# Altium footprint library 20-Switches.PcbLib: 110 footprints (part 1 of 7)
Each footprint in its own frame and in the unit in brackets; x right, y up, seen from the top. Pads: shape width x height; smd on the part's side, far side on the other; paste and mask are expansions set on the pad; w line width, h text height; cw(c..) or ccw(c..) is an arc to the next point about the centre after c.
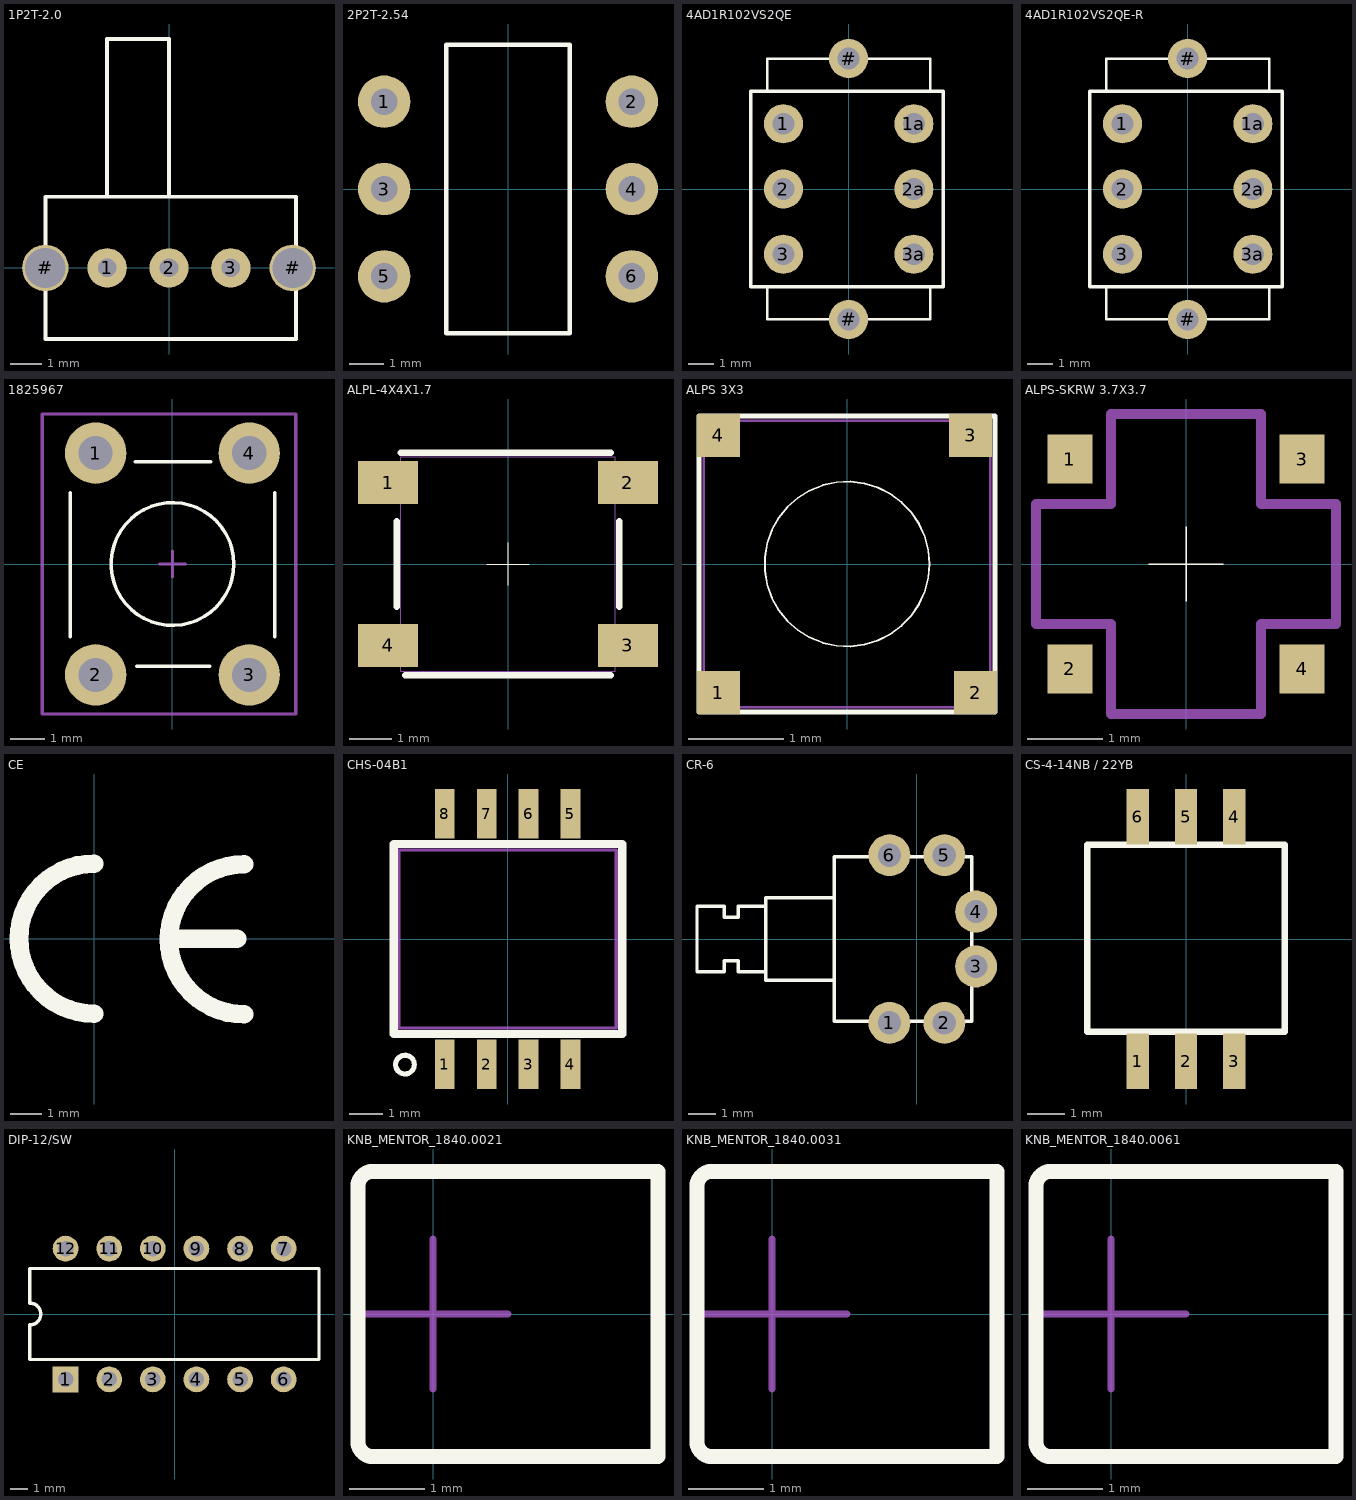
[diagram p0: the footprints below, top view; thin cyan lines are the x and y axes]

## 1P2T-2.0 [mm]
height 18.5
pads (5):
  round 1.27 hole 0.6: 1(-2,0) 2(0,0) 3(2,0)
  round 1.5 hole 1.3: #(-4,0) #(4,0)
Top Overlay:
  lines w0.127: -2,2.3 -2,7.4 0,7.4 0,2.3 ; -4,-2.3 4.1,-2.3 4.1,2.3 -4,2.3 -4,-2.3
3D body "sw-1p2t-2_0.stp": height 4.8, standoff -2.5, extent -4.3,-2.25 4.3,7.95

## 2P2T-2.54 [mil]
height 728.35
pads (6):
  round 60 hole 30: 1(-141.73,100) 2(141.73,100) 3(-141.73,0) 4(141.73,0) 5(-141.73,-100) 6(141.73,-100)
Top Overlay:
  lines w5: -70.87,-165.35 70.87,-165.35 70.87,165.35 -70.87,165.35 -70.87,-165.35
3D body "sw-2p2t-2_54.stp": height 125, standoff -29.53, extent -150.38,-161.41 150.37,161.42

## 4AD1R102VS2QE [mil]
height 728.35
pads (8):
  round 60 hole 33.46: 1(-100,100) 1a(100,100) 2(-100,0) 2a(100,0) 3(-100,-100) 3a(100,-100) #(0,-200) #(0,200)
Top Overlay:
  lines w3.94: -125,-150 -125,-200 125,-200 125,-150 ; -125,150 -125,200 125,200 125,150
  lines w5: -150,-150 145,-150 145,150 -150,150 -150,-150
3D body "ip67-6.stp": height 764.35, standoff -127.13, extent -197.83,-287.54 197.84,324.56

## 4AD1R102VS2QE-R [mil]
height 728.35
pads (8):
  round 60 hole 33.46: 1(-100,100) 1a(100,100) 2(-100,0) 2a(100,0) 3(-100,-100) 3a(100,-100) #(0,-200) #(0,200)
Top Overlay:
  lines w3.94: -125,-150 -125,-200 125,-200 125,-150 ; -125,150 -125,200 100,200 125,200 125,150
  lines w5: -150,-150 -150,150 145,150 145,-150 -150,-150
3D body "ip67-6R.stp": height 764.35, standoff -127.13, extent -197.83,-287.54 197.84,324.56

## 1825967 [mm] "AMP,1825967,6X6"
height 18.5
pads (4):
  round 1.8 hole 1: 1(-2.25,3.25) 2(-2.25,-3.25) 3(2.25,-3.25) 4(2.25,3.25)
Top Overlay:
  circle w0.1: c0,0 r1.799
  lines w0.1: -3,-2.134 -3,2.083 ; -1.092,2.997 1.118,2.997 ; -1.041,-2.997 1.092,-2.997 ; 3,-2.134 3,2.083
Mechanical 11:
  lines w0.1: -0.381,0 0.381,0 ; 0,-0.381 0,0.381 ; -3.81,-4.394 -3.81,4.394 3.607,4.394 3.607,-4.394 -3.81,-4.394
3D body "1825976.stp": height 6.57, standoff -2.29, extent -3,-3.393 3,3.393
3D body "1_6-1_6-0_6-1_8.stp": height 0.05, standoff -1.75, extent -3.05,2.45 -1.45,4.05
3D body "1_6-1_6-0_6-1_8.stp": height 0.05, standoff -1.75, extent 1.45,2.45 3.05,4.05
3D body "1_6-1_6-0_6-1_8.stp": height 0.05, standoff -1.75, extent -3.05,-4.05 -1.45,-2.45
3D body "1_6-1_6-0_6-1_8.stp": height 0.05, standoff -1.75, extent 1.45,-4.05 3.05,-2.45

## ALPL-4X4X1.7 [mm]
height 18.5
pads (4):
  rect 1.4x1 smd: 1(-2.8,1.9) 2(2.8,1.9) 3(2.8,-1.9) 4(-2.8,-1.9)
Top Overlay:
  lines w0.02: -0.5,0 0.5,0 ; 0,-0.5 0,0.5
  lines w0.15: -2.6,-1 -2.6,1 ; -2.5,2.6 2.4,2.6 ; -2.4,-2.6 2.4,-2.6 ; 2.6,-1 2.6,1
Mechanical 14:
  lines w0.01: -2.5,-2.5 -2.5,2.5 2.5,2.5 2.5,-2.5 -2.5,-2.5
3D body "alps_4x4x1_7pad.stp": height 0.02, standoff 0, extent -3.5,-2.4 -2.1,-1.4
3D body "alps_4x4x1_7pad.stp": height 0.02, standoff 0, extent -3.5,1.4 -2.1,2.4
3D body "alps_4x4x1_7pad.stp": height 0.02, standoff 0, extent 2.1,-2.4 3.5,-1.4
3D body "alps_4x4x1_7pad.stp": height 0.02, standoff 0, extent 2.1,1.4 3.5,2.4
3D body "apls_4x4x1_7.stp": height 1.22, standoff 0, extent -3.19,-2.5 3.19,2.5

## ALPS 3X3 [mm]
height 0.6
pads (4):
  rect 0.45x0.45 smd mask+0.07: 1(-1.346,-1.346) 3(1.295,1.346) 4(-1.346,1.346)
  rect 0.45x0.45 smd: 2(1.346,-1.346)
Top Overlay:
  circle w0.02: c0,0 r0.864
  lines w0.05: -1.549,-1.549 -1.549,1.549 1.549,1.549 1.549,-1.549 -1.549,-1.549
Mechanical 15:
  lines w0.03: -1.5,-1.5 -1.5,1.5 1.5,1.5 1.5,-1.5 -1.5,-1.5
3D body "alps_3-3.stp": height 0.6, standoff 0, extent -1.5,-1.5 1.5,1.5

## ALPS-SKRW 3.7X3.7 [mm] "SKRWAEE030"
height 0.6
pads (4):
  rect 0.6x0.65 smd: 1(-1.55,1.4) 2(-1.55,-1.4) 3(1.55,1.4) 4(1.55,-1.4)
Top Overlay:
  lines w0.02: -0.5,0 0.5,0 ; 0,-0.5 0,0.5
Mechanical 15:
  lines w0.127: -2,-0.8 -2,0.8 -1,0.8 -1,2 1,2 1,0.8 2,0.8 2,-0.8 1,-0.8 1,-2 -1,-2 -1,-0.8 -2,-0.8
3D body "apls-3_7-3_7.stp": height 0.4, standoff 0, extent -1.85,-1.85 1.85,1.85

## CE [mm]
Top Overlay:
  lines w0.6: 0,-2.413 cw(c0,0) 0,2.413 ; 2.53,0 4.6,0 ; 4.826,-2.438 cw(c4.826,-0.025) 4.826,2.388
3D body "ce.stp": height 0.02, standoff 0, extent -2.725,-2.725 4.82,2.725

## CHS-04B1 [mm]
pads (8):
  rect 0.6x1.5 smd mask+0.07: 1(-1.905,-3.8) 2(-0.635,-3.8) 3(0.635,-3.8) 4(1.905,-3.8) 5(1.905,3.8) 6(0.635,3.8) 7(-0.635,3.8)
  rect 0.6x1.5 smd: 8(-1.905,3.8)
Top Overlay:
  circle w0.152: c-3.111,-3.81 r0.284
  lines w0.254: -3.454,-2.883 3.48,-2.883 3.48,2.883 -3.454,2.883 -3.454,-2.883
Mechanical 15:
  lines w0.1: -3.3,-2.7 3.3,-2.7 3.3,2.7 -3.3,2.7 -3.3,-2.7
3D body "0_6-1_5.stp": height 0.02, standoff 0, extent 1.605,-4.55 2.205,-3.05
3D body "0_6-1_5.stp": height 0.02, standoff 0, extent 0.335,-4.55 0.935,-3.05
3D body "0_6-1_5.stp": height 0.02, standoff 0, extent -0.935,-4.55 -0.335,-3.05
3D body "0_6-1_5.stp": height 0.02, standoff 0, extent -2.205,-4.55 -1.605,-3.05
3D body "0_6-1_5.stp": height 0.02, standoff 0, extent 1.605,3.05 2.205,4.55
3D body "0_6-1_5.stp": height 0.02, standoff 0, extent 0.335,3.05 0.935,4.55
3D body "0_6-1_5.stp": height 0.02, standoff 0, extent -0.935,3.05 -0.335,4.55
3D body "0_6-1_5.stp": height 0.02, standoff 0, extent -2.205,3.05 -1.605,4.55
3D body "chs-04b1.stp": height 2.55, standoff 0, extent -3.3,-4 3.3,4

## CR-6 [mm]
height 0.6
pads (6):
  round 1.524 hole 0.85: 1(-1,-3.05) 2(1,-3.05) 3(2.15,-1) 4(2.15,1) 5(1,3.05) 6(-1,3.05)
Top Overlay:
  lines w0.127: -5.5,-1.2 -6.5,-1.2 -6.5,-0.8 -7,-0.8 -7,-1.2 -8,-1.2 -8,1.2 -7,1.2 -7,0.8 -6.5,0.8 -6.5,1.2 -5.5,1.2 ; -3,-1.5 -5.5,-1.5 -5.5,1.5 -3,1.5 ; -3,-3 2,-3 2,3 -3,3 -3,-3
3D body "prt0001.stp": height 5.8, standoff -1.4, extent -7.8,-3.2 2.5,3.2

## CS-4-14NB / 22YB [mm]
pads (6):
  rect 0.6x1.5 smd mask+0.07: 1(-1.3,-3.3) 2(0,-3.3) 4(1.3,3.3) 5(0,3.3) 6(-1.3,3.3)
  rect 0.6x1.5 smd: 3(1.3,-3.3)
Top Overlay:
  lines w0.178: -2.667,-2.5 -2.667,2.54 2.667,2.54 2.667,-2.5 -2.667,-2.5
3D body "cs-4_22yb.stp": height 2.3, standoff 0, extent -2.54,-2.667 2.46,2.833

## DIP-12/SW [mm] "DIP Switch; 12 Leads"
height 5.8
pads (12):
  rect 1.5x1.5 hole 0.9: 1(-6.35,-3.81)
  round 1.5 hole 0.9 mask+0.07: 2(-3.81,-3.81) 3(-1.27,-3.81) 4(1.27,-3.81) 5(3.81,-3.81) 6(6.35,-3.81) 7(6.35,3.81) 8(3.81,3.81) 9(1.27,3.81) 10(-1.27,3.81) 11(-3.81,3.81) 12(-6.35,3.81)
Top Overlay:
  lines w0.2: -8.43,-2.65 8.41,-2.65 8.41,2.65 -8.43,2.65 -8.43,0.635 cw(c-8.43,0) -8.43,-0.635 -8.43,-2.65
3D body "dpst-6.stp": height 8.88, standoff -3.43, extent -8.71,-4.953 8.71,4.827

## KNB_MENTOR_1840.0021 [mm] "Red Knob For MENTOR Push-Button Switch (Dia. 3.8mm L=4mm)"
height 3.8
Top Overlay:
  lines w0.2: -1,-1.7 ccw(c-0.8,-1.7) -0.8,-1.9 3,-1.9 3,1.9 -0.8,1.9 ccw(c-0.8,1.7) -1,1.7 -1,-1.7
Mechanical 8:
  lines w0.1: -1,0 0,0 ; 0,-1 0,0 ; 0,1 0,0 ; 1,0 0,0
Mechanical 14:
  lines w0.1: -1,-1.7 ccw(c-0.8,-1.7) -0.8,-1.9 3,-1.9 3,1.9 -0.8,1.9 ccw(c-0.8,1.7) -1,1.7 -1,-1.7
3D body "KNB_MENTOR_1840.0021.stp": height 6.95, standoff 3.15, extent -0.993,-1.9 3.007,1.9

## KNB_MENTOR_1840.0031 [mm] "Black Knob For MENTOR Push-Button Switch (Dia. 3.8mm L=4mm)"
height 3.8
Top Overlay:
  lines w0.2: -1,-1.7 ccw(c-0.8,-1.7) -0.8,-1.9 3,-1.9 3,1.9 -0.8,1.9 ccw(c-0.8,1.7) -1,1.7 -1,-1.7
Mechanical 8:
  lines w0.1: -1,0 0,0 ; 0,-1 0,0 ; 0,1 0,0 ; 1,0 0,0
Mechanical 14:
  lines w0.1: -1,-1.7 ccw(c-0.8,-1.7) -0.8,-1.9 3,-1.9 3,1.9 -0.8,1.9 ccw(c-0.8,1.7) -1,1.7 -1,-1.7
3D body "KNB_MENTOR_1840.0031.stp": height 6.95, standoff 3.15, extent -1,-1.9 3,1.9

## KNB_MENTOR_1840.0061 [mm] "Blue Knob For MENTOR Push-Button Switch (Dia. 3.8mm L=4mm)"
height 3.8
Top Overlay:
  lines w0.2: -1,-1.7 ccw(c-0.8,-1.7) -0.8,-1.9 3,-1.9 3,1.9 -0.8,1.9 ccw(c-0.8,1.7) -1,1.7 -1,-1.7
Mechanical 8:
  lines w0.1: -1,0 0,0 ; 0,-1 0,0 ; 0,1 0,0 ; 1,0 0,0
Mechanical 14:
  lines w0.1: -1,-1.7 ccw(c-0.8,-1.7) -0.8,-1.9 3,-1.9 3,1.9 -0.8,1.9 ccw(c-0.8,1.7) -1,1.7 -1,-1.7
3D body "KNB_MENTOR_1840.0061.stp": height 6.95, standoff 3.15, extent -1,-1.9 3,1.9